# Altium footprint library CADTlink.PcbLib: 143 footprints (part 5 of 9)
Each footprint in its own frame and in the unit in brackets; x right, y up, seen from the top. Pads: shape width x height; smd on the part's side, far side on the other; paste and mask are expansions set on the pad; w line width, h text height; cw(c..) or ccw(c..) is an arc to the next point about the centre after c.
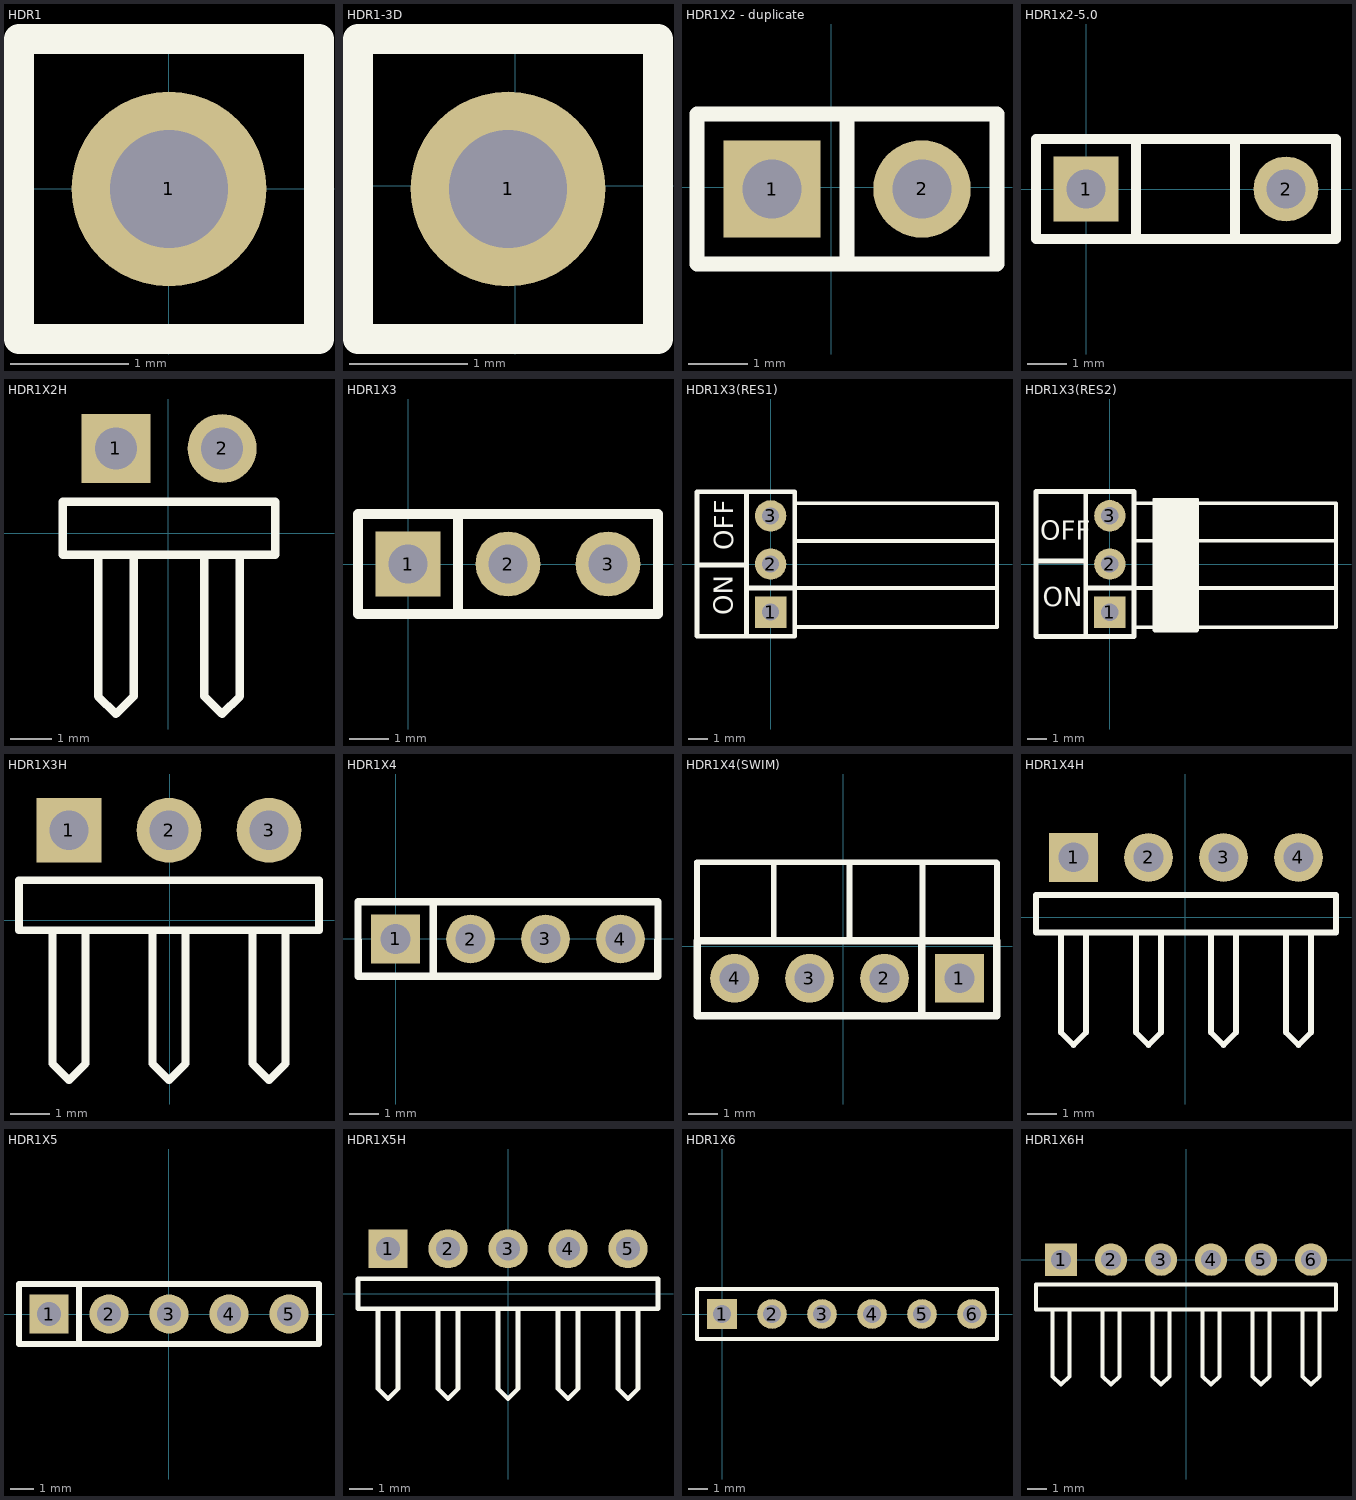
[diagram p4: the footprints below, top view; thin cyan lines are the x and y axes]

## HDR1 [mm] "Socket"
pads (1):
  round 1.65 hole 1: 1(0,0)
Top Overlay:
  lines w0.254: -1.27,-1.27 -1.27,1.27 1.27,1.27 1.27,-1.27 -1.27,-1.27
3D body: height 8.54, standoff -3, extent -1.27,-1.27 1.27,1.27

## HDR1-3D [mm]
pads (1):
  round 1.65 hole 1: 1(-0.06,-0.027)
Top Overlay:
  lines w0.254: -1.33,-1.297 1.21,-1.297 1.21,1.243 -1.33,1.243 -1.33,-1.297
3D body: height 8.54, standoff -3, extent -1.33,-1.296 1.21,1.244

## HDR1X2 - duplicate [mm]
pads (2):
  rect 1.65x1.65 hole 1: 1(-1,-0.027)
  round 1.65 hole 1: 2(1.54,-0.027)
Top Overlay:
  lines w0.254: 0.27,-1.297 0.27,1.243 ; -2.27,-1.297 2.81,-1.297 2.81,1.243 -2.27,1.243 -2.27,-1.297
3D body: height 8.54, standoff -3, extent -2.235,-1.168 2.845,1.372

## HDR1x2-5.0 [mm]
pads (2):
  rect 1.65x1.65 hole 1: 1(0,0)
  round 1.65 hole 1: 2(5.08,0)
Top Overlay:
  lines w0.254: 1.27,-1.27 1.27,1.27 ; 3.785,-1.27 3.785,1.27 ; -1.27,-1.27 6.35,-1.27 6.35,1.27 -1.27,1.27 -1.27,-1.27
3D body: height 8.54, standoff -3, extent -1.194,-1.194 1.346,1.346
3D body: height 8.54, standoff -3, extent 3.81,-1.168 6.35,1.372

## HDR1X2H [mm]
pads (2):
  rect 1.65x1.65 hole 1: 1(-1.248,2.032)
  round 1.65 hole 1: 2(1.292,2.032)
Top Overlay:
  lines w0.2: -1.671,-0.508 -1.671,-3.895 -1.248,-4.318 -0.825,-3.895 -0.825,-0.508 ; 0.869,-0.508 0.869,-3.895 1.292,-4.318 1.715,-3.895 1.715,-0.508 ; -2.518,-0.508 -2.518,0.762 2.562,0.762 2.562,-0.508 -2.518,-0.508

## HDR1X3 [mm] "焊盘间距2.54mm"
height 1.2
pads (3):
  rect 1.65x1.65 hole 1: 1(0,0)
  round 1.65 hole 1: 2(2.54,0) 3(5.08,0)
Top Overlay:
  lines w0.254: 1.27,-1.27 1.27,1.27 ; -1.27,-1.27 6.35,-1.27 6.35,1.27 -1.27,1.27 -1.27,-1.27
3D body: height 8.54, standoff -3, extent -1.27,-1.219 6.35,1.321

## HDR1X3(RES1) [mm]
pads (3):
  rect 1.65x1.65 hole 0.9: 1(0,-2.54)
  round 1.65 hole 0.9: 2(0,0) 3(0,2.54)
Top Layer:
  lines w0.6: 0,2.54 0,2.565
Top Overlay:
  lines w0.2: 1.27,-3.327 11.938,-3.327 11.938,3.2 1.321,3.2 ; 1.27,-1.27 11.938,-1.27 ; 1.27,1.219 11.938,1.219
  lines w0.254: -3.861,-0.051 -1.295,-0.051 ; -1.27,-1.27 1.27,-1.27 ; -1.27,-3.81 -1.27,3.81 ; -1.27,-3.81 1.27,-3.81 1.27,3.81 -1.27,3.81 ; -1.27,-3.81 -3.886,-3.81 -3.886,3.81 -1.27,3.81
  text "ON" at -2.007,-2.692 h1
  text "OFF" at -1.981,0.737 h1
3D body: height 1.27, standoff -1.27, extent -0.105,-3.81 11.435,3.81

## HDR1X3(RES2) [mm]
pads (3):
  rect 1.65x1.65 hole 0.9: 1(0,-2.54)
  round 1.65 hole 0.9: 2(0,0) 3(0,2.54)
Top Layer:
  lines w0.6: 0,2.54 0,2.565
Top Overlay:
  lines w0.1: 4.597,-3.353 2.286,-3.353 ; 4.648,-3.353 4.648,-3.48 4.572,-3.556 2.362,-3.556 2.286,-3.48 2.286,-3.353 ; 4.648,-3.302 4.648,3.2 ; 2.286,-3.353 2.286,0 2.286,3.2 ; 2.286,3.2 2.286,3.404 2.311,3.429 4.623,3.429 4.648,3.404 4.648,3.2 ; 2.286,3.2 4.648,3.2
  lines w0.2: 1.27,-3.327 11.913,-3.327 11.913,3.2 1.321,3.2 ; 1.27,-1.27 11.913,-1.27 ; 1.27,1.219 11.913,1.219 ; 2.413,3.15 2.413,-3.48 4.521,-3.48 ; 2.413,3.353 4.521,3.353 ; 4.547,-3.429 4.547,3.2
  lines w0.254: -3.835,0.152 -1.27,0.152 ; -1.27,-1.27 1.27,-1.27 ; -1.27,-3.81 -3.886,-3.81 -3.886,3.81 -1.27,3.81 ; -1.27,-3.81 1.27,-3.81 1.27,3.81 -1.27,3.81 ; -1.27,-3.81 -1.27,3.81
  lines w0.4: 2.692,-3.251 2.692,3.2 ; 3.023,-3.251 3.023,3.2 ; 3.404,-3.302 3.404,3.15 ; 3.607,-3.302 3.607,3.15 ; 3.886,-3.251 3.886,3.2 ; 4.216,-3.251 4.216,3.2 ; 4.42,-3.251 4.42,3.2
  text "OFF" at -3.658,1.27 h1
  text "ON" at -3.531,-2.235 h1
3D body: height 1.27, standoff -1.27, extent -0.105,-3.81 11.435,3.81

## HDR1X3H [mm]
pads (3):
  rect 1.65x1.65 hole 1: 1(-2.556,2.286)
  round 1.65 hole 1: 2(-0.016,2.286) 3(2.524,2.286)
Top Overlay:
  lines w0.2: -2.979,-0.254 -2.979,-3.641 -2.556,-4.064 -2.133,-3.641 -2.133,-0.254 ; -0.439,-0.254 -0.439,-3.641 -0.016,-4.064 0.407,-3.641 0.407,-0.254 ; 2.101,-0.254 2.101,-3.641 2.524,-4.064 2.947,-3.641 2.947,-0.254 ; -3.826,-0.254 -3.826,1.016 3.794,1.016 3.794,-0.254 -3.826,-0.254
3D body: height 2.27, standoff -0.27, extent -3.835,-7.702 3.785,3.838

## HDR1X4 [mm] "LINK;Connector; Header;"
height 1.2
pads (4):
  rect 1.65x1.65 hole 1: 1(0,0)
  round 1.65 hole 1: 2(2.54,0) 3(5.08,0) 4(7.62,0)
Top Overlay:
  lines w0.254: 1.27,-1.27 1.27,1.27 ; -1.27,-1.27 8.89,-1.27 8.89,1.27 -1.27,1.27 -1.27,-1.27
3D body: height 8.54, standoff -3, extent -1.27,-1.219 8.89,1.321

## HDR1X4(SWIM) [mm] "焊盘间距2.54mm"
pads (4):
  rect 1.65x1.65 hole 1: 1(3.935,-1.09)
  round 1.65 hole 1: 2(1.395,-1.09) 3(-1.145,-1.09) 4(-3.685,-1.09)
Top Overlay:
  lines w0.2: -4.955,0.08 -4.955,2.84 5.18,2.84 ; -2.355,0.18 -2.355,2.84 ; 0.215,0.18 0.215,2.765 ; 2.68,0.08 2.68,2.77 ; 5.205,0.18 5.205,2.815
  lines w0.254: 2.665,-2.36 2.665,0.18 ; -4.955,-2.36 -4.955,0.18 5.205,0.18 5.205,-2.36 -4.955,-2.36
3D body: height 8.54, standoff -3, extent -4.928,-2.337 5.232,0.203

## HDR1X4H [mm]
pads (4):
  rect 1.65x1.65 hole 1: 1(-3.78,2.032)
  round 1.65 hole 1: 2(-1.24,2.032) 3(1.3,2.032) 4(3.84,2.032)
Top Overlay:
  lines w0.2: -4.203,-0.508 -4.203,-3.895 -3.78,-4.318 -3.357,-3.895 -3.357,-0.508 ; -1.663,-0.508 -1.663,-3.895 -1.24,-4.318 -0.817,-3.895 -0.817,-0.508 ; 0.877,-0.508 0.877,-3.895 1.3,-4.318 1.723,-3.895 1.723,-0.508 ; 3.417,-0.508 3.417,-3.895 3.84,-4.318 4.263,-3.895 4.263,-0.508 ; -5.05,-0.508 5.11,-0.508 5.11,0.762 -5.05,0.762 -5.05,-0.508
3D body: height 1.27, standoff -1.27, extent -5.08,-7.803 5.08,3.737

## HDR1X5 [mm]
pads (5):
  rect 1.65x1.65 hole 1: 1(-5.079,0)
  round 1.65 hole 1: 2(-2.539,0) 3(0.001,0) 4(2.541,0) 5(5.081,0)
Top Overlay:
  lines w0.254: -3.809,-1.27 -3.809,1.27 ; -6.349,-1.27 -6.349,1.27 6.351,1.27 6.351,-1.27 -6.349,-1.27
3D body: height 8.54, standoff -3, extent -6.35,-1.245 6.35,1.295

## HDR1X5H [mm]
pads (5):
  rect 1.65x1.65 hole 1: 1(-5.08,1.905)
  round 1.65 hole 1: 2(-2.54,1.905) 3(0,1.905) 4(2.54,1.905) 5(5.08,1.905)
Top Overlay:
  lines w0.2: -5.503,-0.635 -5.503,-4.022 -5.08,-4.445 -4.657,-4.022 -4.657,-0.635 ; -2.963,-0.635 -2.963,-4.022 -2.54,-4.445 -2.117,-4.022 -2.117,-0.635 ; -0.423,-0.635 -0.423,-4.022 0,-4.445 0.423,-4.022 0.423,-0.635 ; 2.117,-0.635 2.117,-4.022 2.54,-4.445 2.963,-4.022 2.963,-0.635 ; 4.657,-0.635 4.657,-4.022 5.08,-4.445 5.503,-4.022 5.503,-0.635 ; -6.35,-0.635 6.35,-0.635 6.35,0.635 -6.35,0.635 -6.35,-0.635
3D body: height 1.27, standoff -1.27, extent -6.35,-8.263 6.35,3.277

## HDR1X6 [mm] "Connector; Header; 6 Position"
pads (6):
  rect 1.5x1.5 hole 0.9: 1(0,0)
  round 1.5 hole 0.9: 2(2.54,0) 3(5.08,0) 4(7.62,0) 5(10.16,0) 6(12.7,0)
Top Overlay:
  lines w0.2: -1.27,-1.27 -1.27,1.27 13.97,1.27 13.97,-1.27 -1.27,-1.27
3D body: height 8.54, standoff -3, extent 11.43,-1.27 13.97,1.27
3D body: height 8.54, standoff -3, extent 8.89,-1.27 11.43,1.27
3D body: height 8.54, standoff -3, extent 6.35,-1.27 8.89,1.27
3D body: height 8.54, standoff -3, extent 3.81,-1.27 6.35,1.27
3D body: height 8.54, standoff -3, extent 1.27,-1.27 3.81,1.27
3D body: height 8.54, standoff -3, extent -1.27,-1.27 1.27,1.27

## HDR1X6H [mm]
pads (6):
  rect 1.65x1.65 hole 1: 1(-6.35,0)
  round 1.65 hole 1: 2(-3.81,0) 3(-1.27,0) 4(1.27,0) 5(3.81,0) 6(6.35,0)
Top Overlay:
  lines w0.2: -6.773,-2.54 -6.773,-5.927 -6.35,-6.35 -5.927,-5.927 -5.927,-2.54 ; -4.233,-2.54 -4.233,-5.927 -3.81,-6.35 -3.387,-5.927 -3.387,-2.54 ; -1.693,-2.54 -1.693,-5.927 -1.27,-6.35 -0.847,-5.927 -0.847,-2.54 ; 0.847,-2.54 0.847,-5.927 1.27,-6.35 1.693,-5.927 1.693,-2.54 ; 3.387,-2.54 3.387,-5.927 3.81,-6.35 4.233,-5.927 4.233,-2.54 ; 5.927,-2.54 5.927,-5.927 6.35,-6.35 6.773,-5.927 6.773,-2.54 ; -7.62,-2.54 -7.62,-1.27 7.62,-1.27 7.62,-2.54 -7.62,-2.54